# Altium footprint library 6-Connectors-4.PcbLib: 166 footprints (part 4 of 12)
Each footprint in its own frame and in the unit in brackets; x right, y up, seen from the top. Pads: shape width x height; smd on the part's side, far side on the other; paste and mask are expansions set on the pad; w line width, h text height; cw(c..) or ccw(c..) is an arc to the next point about the centre after c.
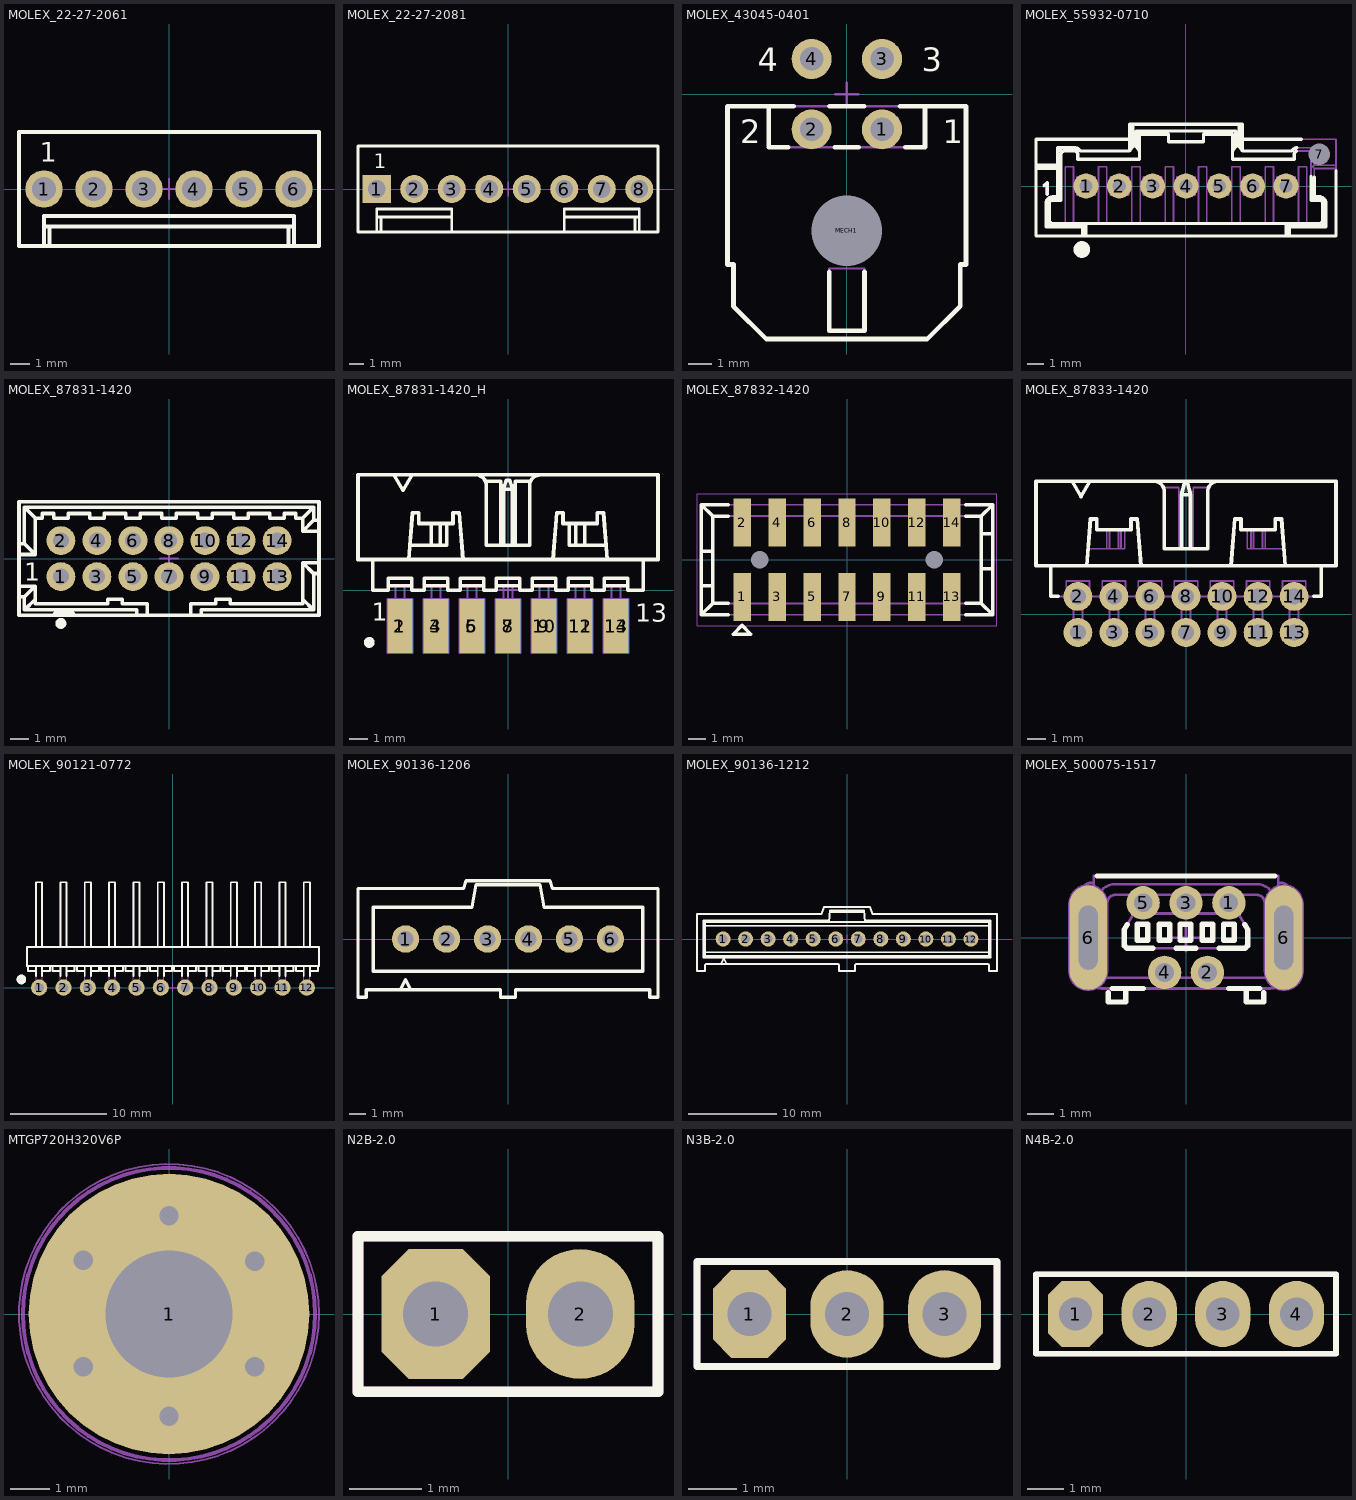
[diagram p3: the footprints below, top view; thin cyan lines are the x and y axes]

## MOLEX_22-27-2061 [mm] "2.54mm (.100\") Pitch KK?Header, Single Row, Vertical, 6 Circuits"
height 11.7
pads (6):
  round 1.9 hole 1.2: 1(-6.35,0) 2(-3.81,0) 3(-1.27,0) 4(1.27,0) 5(3.81,0) 6(6.35,0)
Top Overlay:
  lines w0.2: -6.35,-2.9 -6.35,-1.37 6.35,-1.37 6.35,-2.9 ; -6.35,-1.9 6.35,-1.9 ; -6.077,-2.9 -6.077,-1.9 ; 6.077,-2.9 6.077,-1.9 ; -7.62,-2.9 7.62,-2.9 7.62,2.9 -7.62,2.9 -7.62,-2.9
  text "1" at -6.57,1.395 h1
Mechanical 8:
  lines w0.1: -6.85,0 -6.35,0 ; -6.35,-0.5 -6.35,0 ; -6.35,0.5 -6.35,0 ; -5.85,0 -6.35,0 ; -4.31,0 -3.81,0 ; -3.81,-0.5 -3.81,0 ; -3.81,0.5 -3.81,0 ; -3.31,0 -3.81,0 ; -1.77,0 -1.27,0 ; -1.27,-0.5 -1.27,0 ; -1.27,0.5 -1.27,0 ; -0.77,0 -1.27,0 ; -0.5,0 0,0 ; 0,-0.5 0,0 ; 0,0.5 0,0 ; 0.5,0 0,0 ; 0.77,0 1.27,0 ; 1.27,-0.5 1.27,0 ; 1.27,0.5 1.27,0 ; 1.77,0 1.27,0 ; 3.31,0 3.81,0 ; 3.81,-0.5 3.81,0 ; 3.81,0.5 3.81,0 ; 4.31,0 3.81,0 ; 5.85,0 6.35,0 ; 6.35,-0.5 6.35,0 ; 6.35,0.5 6.35,0 ; 6.85,0 6.35,0
Mechanical 14:
  lines w0.1: -6.35,-2.9 -6.35,-1.37 6.35,-1.37 6.35,-2.9 ; -6.35,-1.9 6.35,-1.9 ; -6.077,-2.9 -6.077,-1.9 ; 6.077,-2.9 6.077,-1.9 ; -7.62,-2.9 7.62,-2.9 7.62,2.9 -7.62,2.9 -7.62,-2.9 ; -6.67,-0.34 -6.67,0.3 -6.03,0.3 -6.03,-0.34 -6.67,-0.34 ; -4.13,-0.34 -3.49,-0.34 -3.49,0.3 -4.13,0.3 -4.13,-0.34 ; -1.59,-0.34 -1.59,0.3 -0.95,0.3 -0.95,-0.34 -1.59,-0.34 ; 0.95,-0.34 0.95,0.3 1.59,0.3 1.59,-0.34 0.95,-0.34 ; 3.49,-0.34 4.13,-0.34 4.13,0.3 3.49,0.3 3.49,-0.34 ; 6.03,-0.34 6.67,-0.34 6.67,0.3 6.03,0.3 6.03,-0.34
  text "1" at -6.57,1.395 h1
3D body "MOLEX_22-27-2061.stp": height 11.7, standoff -3.56, extent -7.62,-2.9 7.62,2.9

## MOLEX_22-27-2081 [mm] "2.54mm (.100\") Pitch KK?Header, Single Row, Vertical, 8 Circuits"
height 11.7
pads (8):
  rect 1.9x1.9 hole 1.2: 1(-8.89,0)
  round 1.9 hole 1.2: 2(-6.35,0) 3(-3.81,0) 4(-1.27,0) 5(1.27,0) 6(3.81,0) 7(6.35,0) 8(8.89,0)
Top Overlay:
  lines w0.2: -8.89,-2.9 -8.89,-1.37 -3.81,-1.37 -3.81,-2.9 ; -8.89,-1.9 -3.81,-1.9 ; -8.617,-2.9 -8.617,-1.9 ; 3.81,-2.9 3.81,-1.37 8.89,-1.37 8.89,-2.9 ; 3.81,-1.9 8.89,-1.9 ; 8.617,-2.9 8.617,-1.9 ; -10.16,-2.9 10.16,-2.9 10.16,2.9 -10.16,2.9 -10.16,-2.9
  text "1" at -9.11,1.395 h1
Mechanical 8:
  lines w0.1: -9.39,0 -8.89,0 ; -8.89,-0.5 -8.89,0 ; -8.89,0.5 -8.89,0 ; -8.39,0 -8.89,0 ; -6.85,0 -6.35,0 ; -6.35,-0.5 -6.35,0 ; -6.35,0.5 -6.35,0 ; -5.85,0 -6.35,0 ; -4.31,0 -3.81,0 ; -3.81,-0.5 -3.81,0 ; -3.81,0.5 -3.81,0 ; -3.31,0 -3.81,0 ; -1.77,0 -1.27,0 ; -1.27,-0.5 -1.27,0 ; -1.27,0.5 -1.27,0 ; -0.77,0 -1.27,0 ; -0.5,0 0,0 ; 0,-0.5 0,0 ; 0,0.5 0,0 ; 0.5,0 0,0 ; 0.77,0 1.27,0 ; 1.27,-0.5 1.27,0 ; 1.27,0.5 1.27,0 ; 1.77,0 1.27,0 ; 3.31,0 3.81,0 ; 3.81,-0.5 3.81,0 ; 3.81,0.5 3.81,0 ; 4.31,0 3.81,0 ; 5.85,0 6.35,0 ; 6.35,-0.5 6.35,0 ; 6.35,0.5 6.35,0 ; 6.85,0 6.35,0 ; 8.39,0 8.89,0 ; 8.89,-0.5 8.89,0 ; 8.89,0.5 8.89,0 ; 9.39,0 8.89,0
Mechanical 14:
  lines w0.1: -8.89,-2.9 -8.89,-1.37 -3.81,-1.37 -3.81,-2.9 ; -8.89,-1.9 -3.81,-1.9 ; -8.617,-2.9 -8.617,-1.9 ; 3.81,-2.9 3.81,-1.37 8.89,-1.37 8.89,-2.9 ; 3.81,-1.9 8.89,-1.9 ; 8.617,-2.9 8.617,-1.9 ; -10.16,-2.9 10.16,-2.9 10.16,2.9 -10.16,2.9 -10.16,-2.9 ; -9.21,-0.34 -9.21,0.3 -8.57,0.3 -8.57,-0.34 -9.21,-0.34 ; -6.67,-0.34 -6.03,-0.34 -6.03,0.3 -6.67,0.3 -6.67,-0.34 ; -4.13,-0.34 -4.13,0.3 -3.49,0.3 -3.49,-0.34 -4.13,-0.34 ; -1.59,-0.34 -1.59,0.3 -0.95,0.3 -0.95,-0.34 -1.59,-0.34 ; 0.95,-0.34 1.59,-0.34 1.59,0.3 0.95,0.3 0.95,-0.34 ; 3.49,-0.34 4.13,-0.34 4.13,0.3 3.49,0.3 3.49,-0.34 ; 6.03,-0.34 6.67,-0.34 6.67,0.3 6.03,0.3 6.03,-0.34 ; 8.57,-0.34 9.21,-0.34 9.21,0.3 8.57,0.3 8.57,-0.34
  text "1" at -9.11,1.395 h1
3D body "MOLEX_22-27-2081.stp": height 11.7, standoff -3.56, extent -10.16,-2.9 10.16,2.9

## MOLEX_43045-0401 [mm] "3.00mm (.118\") Pitch Micro-Fit 3.0?Header, Dual Row, Vertical, with Snap-in Plastic Peg PCB Lock, 4 Circuits"
height 12.8
pads (5):
  round 1.7 hole 1: 1(1.5,-1.5) 2(-1.5,-1.5) 3(1.5,1.5) 4(-1.5,1.5)
  round 1 hole 3 unplated mask+1: MECH1(0,-5.82)
Top Overlay:
  lines w0.2: -3.325,-0.51 -3.325,-2.26 -2.492,-2.26 ; -2.263,-0.51 -5.075,-0.51 -5.075,-7.25 -4.825,-7.25 -4.825,-9.02 -3.425,-10.42 3.425,-10.42 4.825,-9.02 4.825,-7.25 5.075,-7.25 5.075,-0.51 2.263,-0.51 ; -0.75,-7.566 -0.75,-10.07 0.75,-10.07 0.75,-7.566 ; -0.737,-0.51 0.737,-0.51 ; -0.508,-2.26 0.508,-2.26 ; 2.492,-2.26 3.325,-2.26 3.325,-0.51
  text "2" at -4.533,-2.078 h1
  text "4" at -3.783,0.972 h1
  text "3" at 3.192,0.972 h1
  text "1" at 4.092,-2.078 h1
Mechanical 8:
  circle w0.1: c-1.5,-1.5 r0.5
  circle w0.1: c-1.5,1.5 r0.5
  circle w0.1: c1.5,1.5 r0.5
  circle w0.1: c1.5,-1.5 r0.5
  lines w0.1: -2,-1.5 -1.5,-1.5 ; -2,1.5 -1.5,1.5 ; -1.5,-2 -1.5,-1.5 ; -1.5,-1 -1.5,-1.5 ; -1.5,1 -1.5,1.5 ; -1.5,2 -1.5,1.5 ; -1,-1.5 -1.5,-1.5 ; -1,1.5 -1.5,1.5 ; -0.5,-5.82 0,-5.82 ; -0.5,0 0,0 ; 0,-6.32 0,-5.82 ; 0,-5.32 0,-5.82 ; 0,-0.5 0,0 ; 0,0.5 0,0 ; 0.5,-5.82 0,-5.82 ; 0.5,0 0,0 ; 1,-1.5 1.5,-1.5 ; 1,1.5 1.5,1.5 ; 1.5,-2 1.5,-1.5 ; 1.5,-1 1.5,-1.5 ; 1.5,1 1.5,1.5 ; 1.5,2 1.5,1.5 ; 2,-1.5 1.5,-1.5 ; 2,1.5 1.5,1.5
Mechanical 14:
  lines w0.1: -3.325,-0.51 -3.325,-2.26 3.325,-2.26 3.325,-0.51 ; -5.075,-7.25 -4.825,-7.25 -4.825,-9.02 -3.425,-10.42 3.425,-10.42 4.825,-9.02 4.825,-7.25 5.075,-7.25 5.075,-0.51 -5.075,-0.51 -5.075,-7.25 ; -0.75,-10.07 0.75,-10.07 0.75,-7.42 -0.75,-7.42 -0.75,-10.07
  text "2" at -4.533,-2.078 h1
  text "4" at -3.783,0.972 h1
  text "3" at 3.192,0.972 h1
  text "1" at 4.092,-2.078 h1
3D body "MOLEX_43045-0401.stp": height 8.77, standoff -3.18, extent -5.075,-10.42 5.075,1.82
3D body "v160-080.stp": height 0.02, standoff -1.65, extent -2.3,0.7 -0.7,2.3
3D body "v160-080.stp": height 0.02, standoff -1.65, extent 0.7,0.7 2.3,2.3

## MOLEX_55932-0710 [mm] "2.00mm Pitch MicroClasp Wire-to-Board Header, Single Row, Vertical, 7 Circuits, with PCB Locator"
height 9.75
pads (8):
  round 1.5 hole 0.8: 1(-6,0) 2(-4,0) 3(-2,0) 4(0,0) 5(2,0) 6(4,0) 7(6,0)
  round 1 hole 1.3 unplated mask+0.15: 7(8,1.9)
Top Overlay:
  circle w0.5: c-6.25,-3.81 r0.25
  lines w0.2: -9,1.05 -7.7,1.05 ; -9,1.25 -7.7,1.25 ; -8.524,0.001 -8.325,0.2 -8.325,-0.5 ; -8.2,-2.05 ccw(c-8,-2.05) -8,-2.25 ; -7.6,1.15 -7.7,1.25 ; -7.5,1.25 -7.7,1.05 ; -7.441,2.041 -7.7,2.3 ; -6.2,-3 -6.2,-2.45 ; -6,-3 -6,-2.25 ; -3.39,2.8 -9,2.8 -9,-3 9,-3 9,0.92 ; -3.19,3.7 -3.19,2.4 ; -2.79,2.1 -2.99,2.4 ; 2.79,2.1 2.99,2.4 ; 3.19,3.7 3.19,2.4 ; 3.39,2.8 6.928,2.8 ; 6,-3 6,-2.25 ; 6.2,-3 6.2,-2.45 ; 6.612,2.079 ccw(c6.7,1.9) 6.5,1.9 6.5,1.6 2.79,1.6 2.79,3.1 1.05,3.1 1.05,2.65 -1.05,2.65 -1.05,3.1 -2.79,3.1 ; 6.658,2.298 ccw(c6.7,1.9) 6.354,2.1 3.39,2.1 ; 7.5,0.592 7.5,-0.85 ; 7.7,0.533 7.7,-0.65 ; 8,-2.25 ccw(c8,-2.05) 8.2,-2.05 ; -8.4,-2.45 -8.4,-1.05 ; -8.4,-2.45 -8.2,-2.25 ; -8.4,-2.45 -6.2,-2.45 ; -8.4,-1.05 cw(c-8,-1.05) -8,-0.65 ; -8.4,-1.05 -8.2,-1.05 ; -8.2,-2.25 -8.2,-1.05 ; -8.2,-2.25 -6,-2.25 ; -8.2,-1.05 cw(c-8,-1.05) -8,-0.85 ; -8,-0.85 -8,-0.65 ; -8,-0.85 -7.5,-0.85 ; -8,-0.65 -7.7,-0.65 ; -7.7,-0.65 -7.7,1.05 ; -7.7,-0.65 -7.5,-0.85 ; -7.7,1.25 -7.7,2.3 ; -7.7,2.3 -6.7,2.3 cw(c-6.7,1.9) -6.354,2.1 -3.39,2.1 ; -7.5,-0.85 -7.5,1.9 cw(c-7.3,1.9) -7.3,2.1 -6.7,2.1 cw(c-6.7,1.9) -6.5,1.9 -6.5,1.6 -2.79,1.6 -2.79,3.1 ; -6.2,-2.45 -6,-2.25 ; -6,-2.25 6,-2.25 ; -3.39,2.1 -3.19,2.4 ; -3.39,2.1 -3.39,3.7 3.39,3.7 3.39,2.1 ; -3.19,2.4 -2.99,2.4 ; -2.99,2.4 -2.99,3.3 ; -2.99,3.3 2.99,3.3 2.99,2.4 ; -2.99,3.3 -2.79,3.1 ; 2.99,2.4 3.19,2.4 ; 3.19,2.4 3.39,2.1 ; 6,-2.25 6.2,-2.45 ; 6,-2.25 8.2,-2.25 ; 6.2,-2.45 8.4,-2.45 ; 7.5,-0.85 7.7,-0.65 ; 7.5,-0.85 8,-0.85 ; 7.7,-0.65 8,-0.65 ; 8,-0.85 cw(c8,-1.05) 8.2,-1.046 ccw(c8,-1.05) 8,-0.85 ; 8,-0.85 8,-0.65 ; 8,-0.65 cw(c8,-1.05) 8.4,-1.05 ; 8.2,-2.25 8.4,-2.45 ; 8.2,-2.25 8.2,-1.05 8.4,-1.05 ; 8.4,-2.45 8.4,-1.05
Mechanical 8:
  lines w0.1: -6.5,0 -6,0 ; -6,-0.5 -6,0 ; -6,0.5 -6,0 ; -5.5,0 -6,0 ; -4.5,0 -4,0 ; -4,-0.5 -4,0 ; -4,0.5 -4,0 ; -3.5,0 -4,0 ; -2.5,0 -2,0 ; -2,-0.5 -2,0 ; -2,0.5 -2,0 ; -1.5,0 -2,0 ; -0.5,0 0,0 ; 0,-0.5 0,0 ; 0,0.5 0,0 ; 0.5,0 0,0 ; 1.5,0 2,0 ; 2,-0.5 2,0 ; 2,0.5 2,0 ; 2.5,0 2,0 ; 3.5,0 4,0 ; 4,-0.5 4,0 ; 4,0.5 4,0 ; 4.5,0 4,0 ; 5.5,0 6,0 ; 6,-0.5 6,0 ; 6,0.5 6,0 ; 6.5,0 6,0 ; 7.5,1.9 8,1.9 ; 8,1.4 8,1.9 ; 8,2.4 8,1.9 ; 8.5,1.9 8,1.9
Mechanical 14:
  drawing of 210 lines, arcs and shapes, not listed
3D body "MOLEX_55932-0710.stp": height 9.75, standoff -3.2, extent -9,-3 9,3.7

## MOLEX_87831-1420 [mm] "2.00mm (.079\") Pitch Milli-Grid?Header, Vertical, Shrouded, Center Polarization Slot, Locking Window, 14 Circuits"
height 6.4
pads (14):
  round 1.6 hole 0.9: 1(-6,-1) 2(-6,1) 3(-4,-1) 4(-4,1) 5(-2,-1) 6(-2,1) 7(0,-1) 8(0,1) 9(2,-1) 10(2,1) 11(4,-1) 12(4,1) 13(6,-1) 14(6,1)
Top Overlay:
  circle w0.3: c-6,-3.6 r0.15
  lines w0.2: -8.325,-2.125 -8.025,-2.125 ; -8.325,-1.525 -7.425,-1.525 ; -8.325,0.225 -7.425,0.225 ; -8.325,0.825 -8.025,0.825 ; -7.425,-2.25 -8.025,-2.85 ; -6.325,-3.15 -6.325,-3.05 -5.325,-3.05 -5.325,-3.15 ; -1.8,-3.15 -1.8,-2.85 -8.025,-2.85 ; -1.2,-3.15 -1.2,-2.497 -2.6,-2.497 -2.6,-2.25 -3.4,-2.25 -3.4,-2.5 -7.425,-2.5 -7.425,-1.525 ; 1.2,-3.15 1.2,-2.497 2.6,-2.497 2.6,-2.25 3.4,-2.25 3.4,-2.5 7.425,-2.5 7.425,-0.225 ; 1.8,-3.15 1.8,-2.85 8.025,-2.85 ; 7.425,-2.25 8.025,-2.85 ; 8.325,-0.825 8.025,-0.825 ; 8.325,-0.225 7.425,-0.225 ; 8.325,1.525 7.425,1.525 ; 8.325,2.125 8.025,2.125 ; -8.025,-2.85 -8.025,-2.125 ; -8.025,-2.125 -7.425,-1.525 ; -8.025,0.825 -7.425,0.225 ; -8.025,0.825 -8.025,2.85 ; -8.025,2.85 -7.425,2.25 ; -8.025,2.85 8.025,2.85 ; -7.425,0.225 -7.425,2.25 ; -7.425,2.25 -7.025,2.25 -7.025,2.5 -6.4,2.5 -6.4,2.25 -5.6,2.25 -5.6,2.5 -4.4,2.5 -4.4,2.25 -3.6,2.25 -3.6,2.5 -2.4,2.5 -2.4,2.25 -1.6,2.25 -1.6,2.5 -0.4,2.5 -0.4,2.25 0.4,2.25 0.4,2.5 1.6,2.5 1.6,2.25 2.4,2.25 2.4,2.5 3.6,2.5 3.6,2.25 4.4,2.25 4.4,2.5 5.6,2.5 5.6,2.25 6.4,2.25 6.4,2.5 7.025,2.5 7.025,2.25 7.425,2.25 ; 7.425,-0.225 8.025,-0.825 ; 7.425,1.525 8.025,2.125 ; 7.425,1.525 7.425,2.25 ; 7.425,2.25 8.025,2.85 ; 8.025,-2.85 8.025,-0.825 ; 8.025,2.125 8.025,2.85 ; -8.325,-3.15 -8.325,3.15 8.325,3.15 8.325,-3.15 -8.325,-3.15
  text "1" at -8.032,-1.229 h1.02
Mechanical 8:
  lines w0.1: -6.5,-1 -6,-1 ; -6.5,1 -6,1 ; -6,-1.5 -6,-1 ; -6,-0.5 -6,-1 ; -6,0.5 -6,1 ; -6,1.5 -6,1 ; -5.5,-1 -6,-1 ; -5.5,1 -6,1 ; -4.5,-1 -4,-1 ; -4.5,1 -4,1 ; -4,-1.5 -4,-1 ; -4,-0.5 -4,-1 ; -4,0.5 -4,1 ; -4,1.5 -4,1 ; -3.5,-1 -4,-1 ; -3.5,1 -4,1 ; -2.5,-1 -2,-1 ; -2.5,1 -2,1 ; -2,-1.5 -2,-1 ; -2,-0.5 -2,-1 ; -2,0.5 -2,1 ; -2,1.5 -2,1 ; -1.5,-1 -2,-1 ; -1.5,1 -2,1 ; -0.5,-1 0,-1 ; -0.5,0 0,0 ; -0.5,1 0,1 ; 0,-1.5 0,-1 ; 0,1.5 0,1 ; 0.5,-1 0,-1 ; 0.5,0 0,0 ; 0.5,1 0,1 ; 1.5,-1 2,-1 ; 1.5,1 2,1 ; 2,-1.5 2,-1 ; 2,-0.5 2,-1 ; 2,0.5 2,1 ; 2,1.5 2,1 ; 2.5,-1 2,-1 ; 2.5,1 2,1 ; 3.5,-1 4,-1 ; 3.5,1 4,1 ; 4,-1.5 4,-1 ; 4,-0.5 4,-1 ; 4,0.5 4,1 ; 4,1.5 4,1 ; 4.5,-1 4,-1 ; 4.5,1 4,1 ; 5.5,-1 6,-1 ; 5.5,1 6,1 ; 6,-1.5 6,-1 ; 6,-0.5 6,-1 ; 6,0.5 6,1 ; 6,1.5 6,1 ; 6.5,-1 6,-1 ; 6.5,1 6,1 ; 0,-1 0,-0.5 0,0 ; 0,0 0,0.5 0,1
Mechanical 14:
  lines w0.1: -8.325,-2.125 -8.025,-2.125 ; -8.325,-1.525 -7.425,-1.525 ; -8.325,0.225 -7.425,0.225 ; -8.325,0.825 -8.025,0.825 ; -7.425,-2.25 -8.025,-2.85 ; -6.325,-3.15 -6.325,-3.05 -5.325,-3.05 -5.325,-3.15 ; -1.8,-3.15 -1.8,-2.85 -8.025,-2.85 ; -1.2,-3.15 -1.2,-2.497 -2.6,-2.497 -2.6,-2.25 -3.4,-2.25 -3.4,-2.5 -7.425,-2.5 -7.425,-1.525 ; 1.2,-3.15 1.2,-2.497 2.6,-2.497 2.6,-2.25 3.4,-2.25 3.4,-2.5 7.425,-2.5 7.425,-0.225 ; 1.8,-3.15 1.8,-2.85 8.025,-2.85 ; 7.425,-2.25 8.025,-2.85 ; 8.325,-0.825 8.025,-0.825 ; 8.325,-0.225 7.425,-0.225 ; 8.325,1.525 7.425,1.525 ; 8.325,2.125 8.025,2.125 ; -8.025,-2.85 -8.025,-2.125 ; -8.025,-2.125 -7.425,-1.525 ; -8.025,0.825 -7.425,0.225 ; -8.025,0.825 -8.025,2.85 ; -8.025,2.85 -7.425,2.25 ; -8.025,2.85 8.025,2.85 ; -7.425,0.225 -7.425,2.25 ; -7.425,2.25 -7.025,2.25 -7.025,2.5 -6.4,2.5 -6.4,2.25 -5.6,2.25 -5.6,2.5 -4.4,2.5 -4.4,2.25 -3.6,2.25 -3.6,2.5 -2.4,2.5 -2.4,2.25 -1.6,2.25 -1.6,2.5 -0.4,2.5 -0.4,2.25 0.4,2.25 0.4,2.5 1.6,2.5 1.6,2.25 2.4,2.25 2.4,2.5 3.6,2.5 3.6,2.25 4.4,2.25 4.4,2.5 5.6,2.5 5.6,2.25 6.4,2.25 6.4,2.5 7.025,2.5 7.025,2.25 7.425,2.25 ; 7.425,-0.225 8.025,-0.825 ; 7.425,1.525 8.025,2.125 ; 7.425,1.525 7.425,2.25 ; 7.425,2.25 8.025,2.85 ; 8.025,-2.85 8.025,-0.825 ; 8.025,2.125 8.025,2.85 ; -8.325,-3.15 -8.325,3.15 8.325,3.15 8.325,-3.15 -8.325,-3.15 ; -6.25,-1.25 -6.25,-0.75 -5.75,-0.75 -5.75,-1.25 -6.25,-1.25 ; -6.25,0.75 -6.25,1.25 -5.75,1.25 -5.75,0.75 -6.25,0.75 ; -4.25,-1.25 -4.25,-0.75 -3.75,-0.75 -3.75,-1.25 -4.25,-1.25 ; -4.25,0.75 -4.25,1.25 -3.75,1.25 -3.75,0.75 -4.25,0.75 ; -2.25,-1.25 -2.25,-0.75 -1.75,-0.75 -1.75,-1.25 -2.25,-1.25 ; -2.25,0.75 -2.25,1.25 -1.75,1.25 -1.75,0.75 -2.25,0.75 ; -0.25,-1.25 -0.25,-0.75 0.25,-0.75 0.25,-1.25 -0.25,-1.25 ; -0.25,0.75 -0.25,1.25 0.25,1.25 0.25,0.75 -0.25,0.75 ; 1.75,-1.25 1.75,-0.75 2.25,-0.75 2.25,-1.25 1.75,-1.25 ; 1.75,0.75 1.75,1.25 2.25,1.25 2.25,0.75 1.75,0.75 ; 3.75,-1.25 3.75,-0.75 4.25,-0.75 4.25,-1.25 3.75,-1.25 ; 3.75,0.75 3.75,1.25 4.25,1.25 4.25,0.75 3.75,0.75 ; 5.75,-1.25 5.75,-0.75 6.25,-0.75 6.25,-1.25 5.75,-1.25 ; 5.75,0.75 5.75,1.25 6.25,1.25 6.25,0.75 5.75,0.75
  text "1" at -8.032,-1.229 h1.02
3D body "MOLEX_87831-1420.stp": height 6.4, standoff -2.5, extent -8.325,-3.15 8.325,3.15

## MOLEX_87831-1420_H [mm] "2.00mm (.079\") Pitch Milli-Grid?Header, Vertical, Shrouded, Center Polarization Slot, Locking Window, 14 Circuits (Customized PCB Edge assembly)"
height 3.15
pads (14):
  rect 1.4x3 smd paste-1.5: 1(-6,-2) 3(-4,-2) 5(-2,-2) 7(0,-2) 9(2,-2) 11(4,-2) 13(6,-2)
  rect 1.4x3 smd far side paste-1.5: 2(-6,-2) 4(-4,-2) 6(-2,-2) 8(0,-2) 10(2,-2) 12(4,-2) 14(6,-2)
Top Overlay:
  circle w0.3: c-7.7,-2.9 r0.15
  lines w0.2: -7.5,1.7 -7.5,0 -6.65,0 -6.65,0.654 -5.35,0.654 -5.35,0 -4.65,0 -4.65,0.654 -3.35,0.654 -3.35,0 -2.65,0 -2.65,0.654 -1.35,0.654 -1.35,0 -0.65,0 -0.65,0.654 0.65,0.654 0.65,0 1.35,0 1.35,0.654 2.65,0.654 2.65,0 3.35,0 3.35,0.654 4.65,0.654 4.65,0 5.35,0 5.35,0.654 6.65,0.654 6.65,0 7.5,0 7.5,1.7 ; -6.65,0.25 -5.35,0.25 ; -6.325,6.4 -5.825,5.534 -5.325,6.4 ; -5.5,1.7 -5.3,4.3 -4.95,4.3 -4.95,3.7 -3.05,3.7 -3.05,4.3 -2.7,4.3 -2.5,1.7 ; -5.438,2.5 -3.4,2.5 -3.4,3.7 -4.25,3.7 -4.25,2.5 ; -4.65,0.25 -3.35,0.25 ; -3.75,2.5 -3.75,3.7 ; -2.65,0.25 -1.35,0.25 ; -1.8,6.4 cw(c-1.8,5.8) -1.2,5.8 -1.2,2.5 ; -1.255,6.05 -0.4,6.05 -0.4,2.5 ; -0.65,0.25 0.65,0.25 ; -0.4,5.8 -0.19,5.8 ; -0.25,2.5 -0.25,5.6 ; 0.19,5.8 0.4,5.8 ; 0.25,2.5 0.25,5.6 ; 0.4,2.5 0.4,6.05 1.255,6.05 ; 1.35,0.25 2.65,0.25 ; 1.8,6.4 ccw(c1.8,5.8) 1.2,5.8 1.2,2.5 ; 2.5,1.7 2.7,4.3 3.05,4.3 3.05,3.7 4.95,3.7 4.95,4.3 5.3,4.3 5.5,1.7 ; 3.35,0.25 4.65,0.25 ; 3.75,2.5 3.75,3.7 ; 4.25,2.5 4.25,3.7 3.4,3.7 3.4,2.5 5.438,2.5 ; 5.35,0.25 6.65,0.25 ; -1.2,2.5 1.2,2.5 ; -1.2,2.5 1.2,2.5 ; -0.25,5.6 0.25,5.6 ; -0.25,5.6 -0.1,6.1 0.1,6.1 0.25,5.6 ; -8.325,1.7 8.325,1.7 8.325,6.4 -8.325,6.4 -8.325,1.7
  text "13" at 7.05,-1.75 h1.02
  text "1" at -7.55,-1.7 h1.02
Bottom Overlay:
  text "14" at 8.5,-1.7 h1.02
  text "2" at -7,-1.7 h1.02
Mechanical 8:
  lines w0.1: -6.5,-2 -6,-2 ; -6,-2.5 -6,-2 ; -6,-1.5 -6,-2 ; -5.5,-2 -6,-2 ; -4.5,-2 -4,-2 ; -4,-2.5 -4,-2 ; -4,-1.5 -4,-2 ; -3.5,-2 -4,-2 ; -2.5,-2 -2,-2 ; -2,-2.5 -2,-2 ; -2,-1.5 -2,-2 ; -1.5,-2 -2,-2 ; -0.5,-2 0,-2 ; -0.5,0 0,0 ; 0,-2.5 0,-2 ; 0,-1.5 0,-2 ; 0,-0.5 0,0 ; 0,0.5 0,0 ; 0.5,-2 0,-2 ; 0.5,0 0,0 ; 1.5,-2 2,-2 ; 2,-2.5 2,-2 ; 2,-1.5 2,-2 ; 2.5,-2 2,-2 ; 3.5,-2 4,-2 ; 4,-2.5 4,-2 ; 4,-1.5 4,-2 ; 4.5,-2 4,-2 ; 5.5,-2 6,-2 ; 6,-2.5 6,-2 ; 6,-1.5 6,-2 ; 6.5,-2 6,-2 ; -6.7,-3.5 -6.7,-0.5 -5.3,-0.5 -5.3,-3.5 -6.7,-3.5 ; -4.7,-3.5 -4.7,-0.5 -3.3,-0.5 -3.3,-3.5 -4.7,-3.5 ; -2.7,-3.5 -2.7,-0.5 -1.3,-0.5 -1.3,-3.5 -2.7,-3.5 ; -0.7,-3.5 -0.7,-0.5 0.7,-0.5 0.7,-3.5 -0.7,-3.5 ; 1.3,-3.5 1.3,-0.5 2.7,-0.5 2.7,-3.5 1.3,-3.5 ; 3.3,-3.5 3.3,-0.5 4.7,-0.5 4.7,-3.5 3.3,-3.5 ; 5.3,-3.5 5.3,-0.5 6.7,-0.5 6.7,-3.5 5.3,-3.5
Mechanical 14:
  lines w0.1: -7.5,1.7 -7.5,0 -6.65,0 -6.65,0.654 -5.35,0.654 -5.35,0 -4.65,0 -4.65,0.654 -3.35,0.654 -3.35,0 -2.65,0 -2.65,0.654 -1.35,0.654 -1.35,0 -0.65,0 -0.65,0.654 0.65,0.654 0.65,0 1.35,0 1.35,0.654 2.65,0.654 2.65,0 3.35,0 3.35,0.654 4.65,0.654 4.65,0 5.35,0 5.35,0.654 6.65,0.654 6.65,0 7.5,0 7.5,1.7 ; -6.65,0.25 -5.35,0.25 ; -6.325,6.4 -5.825,5.534 -5.325,6.4 ; -6.25,0.25 -6.25,-2 ; -5.75,0.25 -5.75,-2 ; -5.5,1.7 -5.3,4.3 -4.95,4.3 -4.95,3.7 -3.05,3.7 -3.05,4.3 -2.7,4.3 -2.5,1.7 ; -5.438,2.5 -3.4,2.5 -3.4,3.7 -4.25,3.7 -4.25,2.5 ; -4.65,0.25 -3.35,0.25 ; -4.25,0.25 -4.25,-2 ; -3.75,0.25 -3.75,-2 ; -3.75,2.5 -3.75,3.7 ; -2.65,0.25 -1.35,0.25 ; -2.25,0.25 -2.25,-2 ; -1.8,6.4 cw(c-1.8,5.8) -1.2,5.8 -1.2,2.5 ; -1.75,0.25 -1.75,-2 ; -1.255,6.05 -0.4,6.05 -0.4,2.5 ; -0.65,0.25 0.65,0.25 ; -0.4,5.8 -0.19,5.8 ; -0.25,0.25 -0.25,-2 ; -0.25,2.5 -0.25,5.6 ; 0.19,5.8 0.4,5.8 ; 0.25,0.25 0.25,-2 ; 0.25,2.5 0.25,5.6 ; 0.4,2.5 0.4,6.05 1.255,6.05 ; 1.35,0.25 2.65,0.25 ; 1.75,0.25 1.75,-2 ; 1.8,6.4 ccw(c1.8,5.8) 1.2,5.8 1.2,2.5 ; 2.25,0.25 2.25,-2 ; 2.5,1.7 2.7,4.3 3.05,4.3 3.05,3.7 4.95,3.7 4.95,4.3 5.3,4.3 5.5,1.7 ; 3.35,0.25 4.65,0.25 ; 3.75,0.25 3.75,-2 ; 3.75,2.5 3.75,3.7 ; 4.25,0.25 4.25,-2 ; 4.25,2.5 4.25,3.7 3.4,3.7 3.4,2.5 5.438,2.5 ; 5.35,0.25 6.65,0.25 ; 5.75,0.25 5.75,-2 ; 6.25,0.25 6.25,-2 ; -6.25,-2 -6.1,-2.5 -5.9,-2.5 -5.75,-2 ; -6.25,-2 -5.75,-2 ; -4.25,-2 -4.1,-2.5 -3.9,-2.5 -3.75,-2 ; -4.25,-2 -3.75,-2 ; -2.25,-2 -2.1,-2.5 -1.9,-2.5 -1.75,-2 ; -2.25,-2 -1.75,-2 ; -1.2,2.5 1.2,2.5 ; -1.2,2.5 1.2,2.5 ; -0.25,-2 -0.1,-2.5 0.1,-2.5 0.25,-2 ; -0.25,-2 0.25,-2 ; -0.25,5.6 0.25,5.6 ; -0.25,5.6 -0.1,6.1 0.1,6.1 0.25,5.6 ; 1.75,-2 1.9,-2.5 2.1,-2.5 2.25,-2 ; 1.75,-2 2.25,-2 ; 3.75,-2 3.9,-2.5 4.1,-2.5 4.25,-2 ; 3.75,-2 4.25,-2 ; 5.75,-2 5.9,-2.5 6.1,-2.5 6.25,-2 ; 5.75,-2 6.25,-2 ; -8.325,1.7 8.325,1.7 8.325,6.4 -8.325,6.4 -8.325,1.7
3D body "p300-140.stp": height 0.02, standoff 0, extent 5.269,-3.532 6.669,-0.532
3D body "p300-140.stp": height 0.02, standoff 0, extent 3.237,-3.532 4.637,-0.532
3D body "p300-140.stp": height 0.02, standoff 0, extent 1.332,-3.532 2.732,-0.532
3D body "p300-140.stp": height 0.02, standoff 0, extent -0.7,-3.532 0.7,-0.532
3D body "p300-140.stp": height 0.02, standoff 0, extent -2.732,-3.532 -1.332,-0.532
3D body "p300-140.stp": height 0.02, standoff 0, extent -4.637,-3.532 -3.237,-0.532
3D body "p300-140.stp": height 0.02, standoff 0, extent -6.669,-3.532 -5.269,-0.532
3D body "MOLEX_87831-1420_h.stp": height 2.35, standoff -3.95, extent -8.325,-2.5 8.325,6.4
